# Altium footprint library base.PcbLib: 116 footprints (part 1 of 8)
Each footprint in its own frame and in the unit in brackets; x right, y up, seen from the top. Pads: shape width x height; smd on the part's side, far side on the other; paste and mask are expansions set on the pad; w line width, h text height; cw(c..) or ccw(c..) is an arc to the next point about the centre after c.
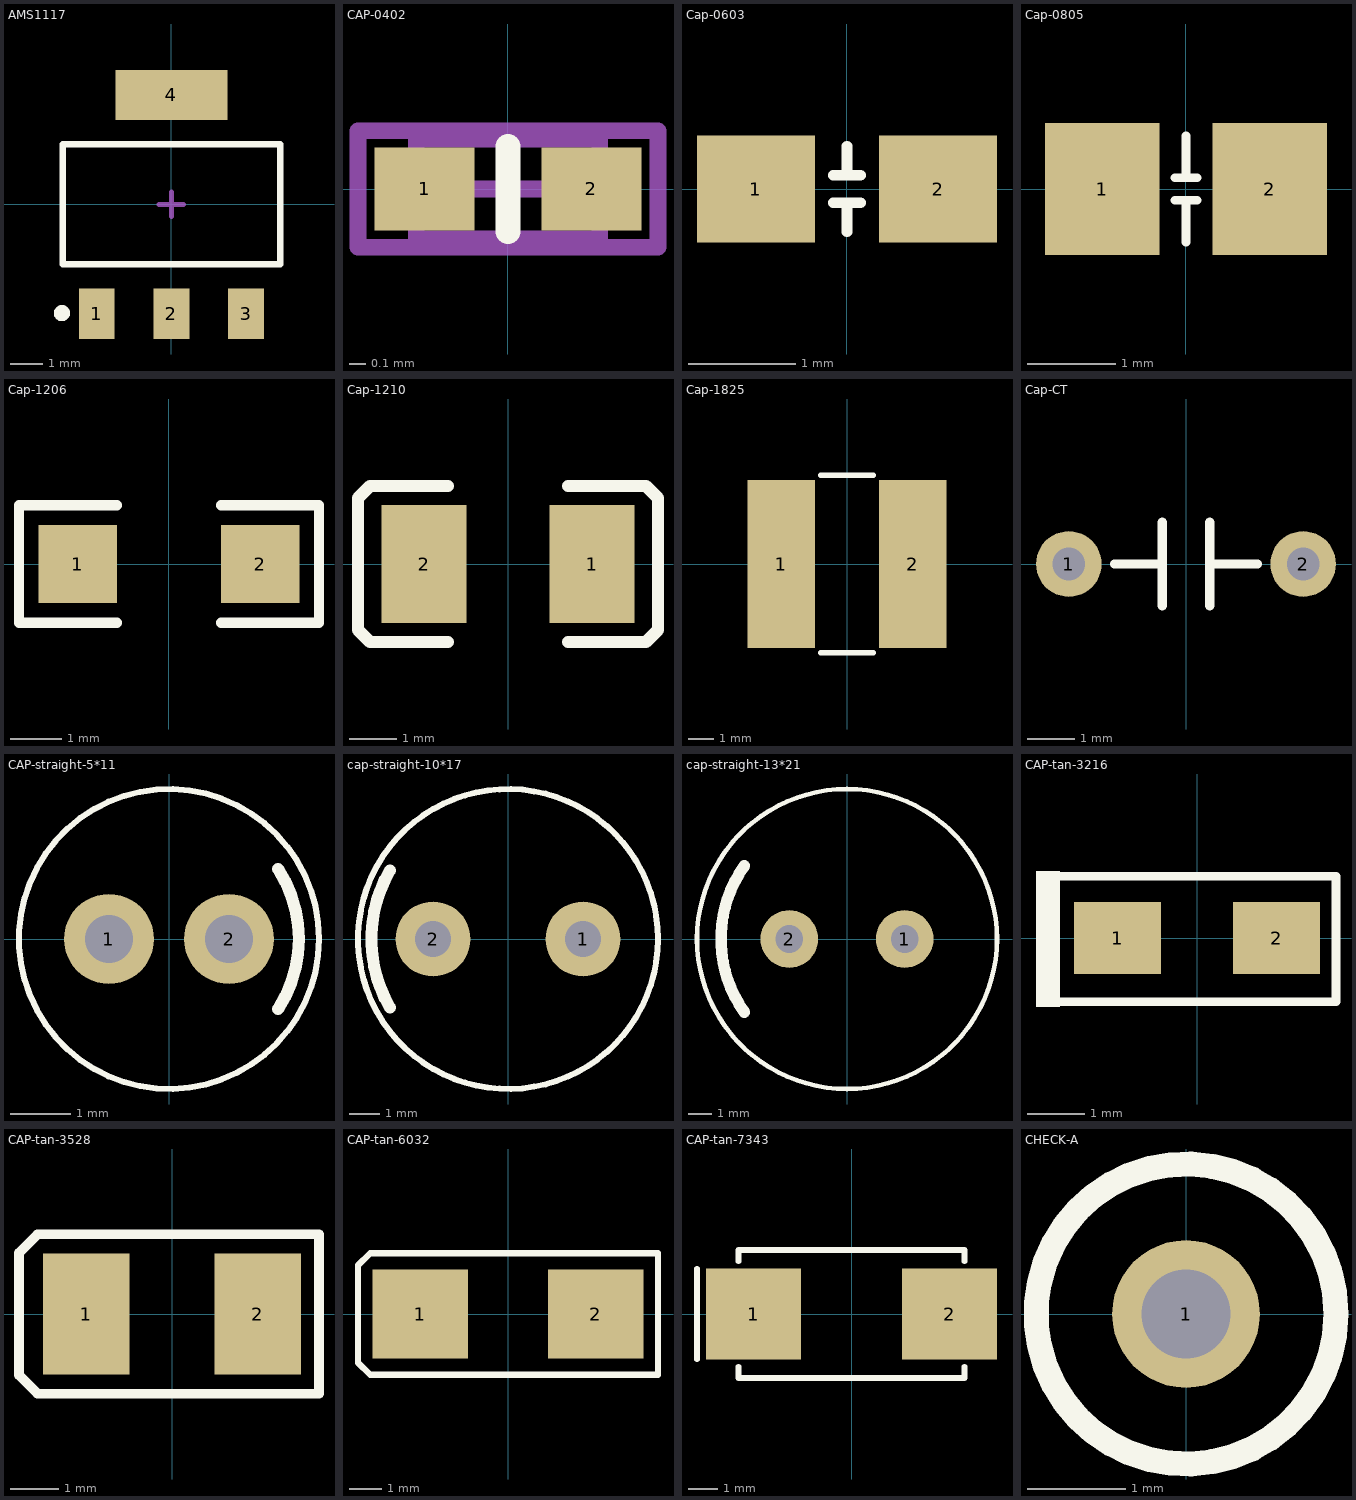
[diagram p0: the footprints below, top view; thin cyan lines are the x and y axes]

## AMS1117 [mm]
pads (4):
  rect 1.1x1.55 smd: 1(-2.3,-3.375) 2(0,-3.375) 3(2.3,-3.375)
  rect 3.45x1.55 smd: 4(0,3.375)
Top Overlay:
  circle w0.25: c-3.376,-3.353 r0.125
  lines w0.2: -3.35,-1.85 3.35,-1.85 3.35,1.85 -3.35,1.85 -3.35,-1.85
Mechanical 15:
  lines w0.15: -0.381,0 0.381,0 ; 0,-0.381 0,0.381
3D body "AMS1117.STEP": height 1.85, standoff -0.01, extent -3.251,-3.576 3.249,3.423

## CAP-0402 [mm]
height 1.3
pads (2):
  rect 0.6x0.5 smd: 1(-0.5,0) 2(0.5,0)
Top Overlay:
  lines w0.15: 0,-0.254 0,0.254
Mechanical 13:
  lines w0.1: -0.55,-0.3 0.55,-0.3 0.55,0.3 -0.55,0.3 -0.55,-0.3
Mechanical 15:
  lines w0.1: -0.3,0 0.3,0 ; 0,-0.3 0,0.3 ; -0.9,-0.35 0.9,-0.35 0.9,0.35 -0.9,0.35 -0.9,-0.35
3D body "CAPC1005(0402).STEP": height 0.5, standoff 0, extent -0.5,-0.25 0.5,0.25

## Cap-0603 [mm]
height 0.6
pads (2):
  rect 1.1x1 smd: 1(-0.85,0) 2(0.85,0)
Top Overlay:
  lines w0.1: -0.127,-0.127 0.127,-0.127 ; -0.127,0.127 0.127,0.127 ; 0,-0.4 0,-0.127 ; 0,0.127 0,0.4
3D body "CAPC1608(0603).STEP": height 0.6, standoff 0, extent -0.8,-0.4 0.8,0.4

## Cap-0805 [mm]
height 1
pads (2):
  rect 1.3x1.5 smd: 1(-0.95,0) 2(0.95,0)
Top Overlay:
  lines w0.1: -0.127,-0.127 0.127,-0.127 ; -0.127,0.127 0.127,0.127 ; 0,-0.6 0,-0.127 ; 0,0.127 0,0.6
3D body "CAPC2012(0805).STEP": height 0.95, standoff 0, extent -1,-0.6 1,0.6

## Cap-1206 [mil]
height 118.11
pads (2):
  rect 60x60 smd: 1(-70,0) 2(70,0)
Top Overlay:
  lines w7.87: -40,-45 -115,-45 -115,45 -40,45 ; 40,-45 115,-45 115,45 40,45
3D body "CAPC3216(1206).STEP": height 37.4, standoff 0, extent -62.99,-31.49 63,31.5

## Cap-1210 [mm]
height 3
pads (2):
  rect 1.8x2.5 smd: 1(1.778,0) 2(-1.778,0)
Top Overlay:
  lines w0.254: -1.27,-1.651 -2.921,-1.651 -3.175,-1.397 -3.175,1.397 -2.921,1.651 -1.27,1.651 ; 1.27,-1.651 2.921,-1.651 3.175,-1.397 3.175,1.397 2.921,1.651 1.27,1.651
3D body "CAPC3225(1210).STEP": height 1.3, standoff 0, extent -1.6,-1.25 1.6,1.25

## Cap-1825 [mm]
pads (2):
  rect 2.6x6.5 smd: 1(-2.54,0) 2(2.54,0)
Top Overlay:
  lines w0.2: -1.016,-3.429 1.016,-3.429 ; -1.016,3.429 1.016,3.429
3D body "CAPC4564(1825).STEP": height 1.5, standoff 0, extent -2.25,-3.2 2.25,3.2

## Cap-CT [mm] "独石电容-直插"
pads (2):
  round 1.4 hole 0.7: 1(-2.5,0) 2(2.5,0)
Top Overlay:
  lines w0.2: -1.524,0 -0.508,0 ; -0.508,-0.889 -0.508,0.889 ; 0.508,-0.889 0.508,0.889 ; 0.508,0 1.524,0

## CAP-straight-5*11 [mm]
pads (2):
  round 1.5 hole 0.8: 1(-1,0) 2(1,0)
Top Overlay:
  circle w0.1: c0,0 r2.5
  lines w0.2: 1.819,-1.17 ccw(c0,0) 1.819,1.17

## cap-straight-10*17 [mm]
pads (2):
  round 2.5 hole 1.2: 1(2.5,0) 2(-2.5,0)
Top Overlay:
  circle w0.2: c0,0 r5
  lines w0.4: -3.937,-2.286 cw(c0,0) -3.937,2.286
3D body "Cap 10×17.STEP": height 17.01, standoff -3, extent -5.01,-5 5,5
3D body: height 0.25, standoff 0, extent 0,0 0,0

## cap-straight-13*21 [mm]
pads (2):
  round 2.5 hole 1.2: 1(2.5,0) 2(-2.5,0)
Top Overlay:
  circle w0.2: c0,0 r6.5
  lines w0.5: -4.445,-3.175 cw(c0,0) -4.445,3.175
3D body "Cap 10×17.STEP": height 17.01, standoff -3, extent -5.01,-5 5,5
3D body: height 0.25, standoff 0, extent 0,0 0,0

## CAP-tan-3216 [mil] "钽电容"
height 78.74
pads (2):
  rect 60x50 smd: 1(-55,0) 2(55,0)
Top Overlay:
  region: -95,46.39 -111.46,46.39 -111.46,-47.61 -95,-47.61
  lines w5.91: -94.83,-43.92 96.11,-43.92 96.11,42.69 -94.83,42.69
3D body "User Library-cap3216h160.STEP": height 62.99, standoff 0, extent -62.99,-31.5 62.99,31.49

## CAP-tan-3528 [mm] "钽电容"
height 3
pads (2):
  rect 1.8x2.5 smd: 1(-1.778,0) 2(1.778,0)
Top Overlay:
  lines w0.2: -3.175,-1.27 -3.175,1.27 -2.794,1.651 -1.778,1.651 1.778,1.651 3.048,1.651 3.048,-1.651 1.775,-1.651 -1.778,-1.651 -2.794,-1.651 -3.175,-1.27
3D body "CAP-B.STEP": height 1.91, standoff 0, extent -1.746,-1.4 1.746,1.4

## CAP-tan-6032 [mm] "钽电容"
pads (2):
  rect 3x2.8 smd: 1(-2.75,0) 2(2.75,0)
Top Overlay:
  lines w0.2: -4.699,1.27 -4.699,1.524 ; -4.699,1.524 -4.699,-1.524 -4.318,-1.905 4.699,-1.905 4.699,1.905 -4.318,1.905 -4.699,1.524
3D body "CAP-C.STEP": height 2.67, standoff -0.02, extent -3.093,-1.605 3.093,1.6

## CAP-tan-7343 [mm] "钽电容"
height 4
pads (2):
  rect 3.2x3.05 smd: 1(-3.302,0) 2(3.302,0)
Top Overlay:
  lines w0.2: -5.207,-1.524 -5.207,1.524 ; -3.81,-1.778 -3.81,-2.159 3.81,-2.159 3.81,-1.778 ; -3.81,1.778 -3.81,2.159 3.81,2.159 3.81,1.778
3D body "CAP-D.STEP": height 2.8, standoff -0.01, extent -3.647,-2.15 3.647,2.15

## CHECK-A [mm] "测试点"
height 1.45
pads (1):
  round 1.5 hole 0.9: 1(0,0)
Top Overlay:
  circle w0.254: c0,0 r1.524